# Altium footprint library COOP4403_FULL.PcbLib: 52 footprints (part 3 of 4)
Each footprint in its own frame and in the unit in brackets; x right, y up, seen from the top. Pads: shape width x height; smd on the part's side, far side on the other; paste and mask are expansions set on the pad; w line width, h text height; cw(c..) or ccw(c..) is an arc to the next point about the centre after c.
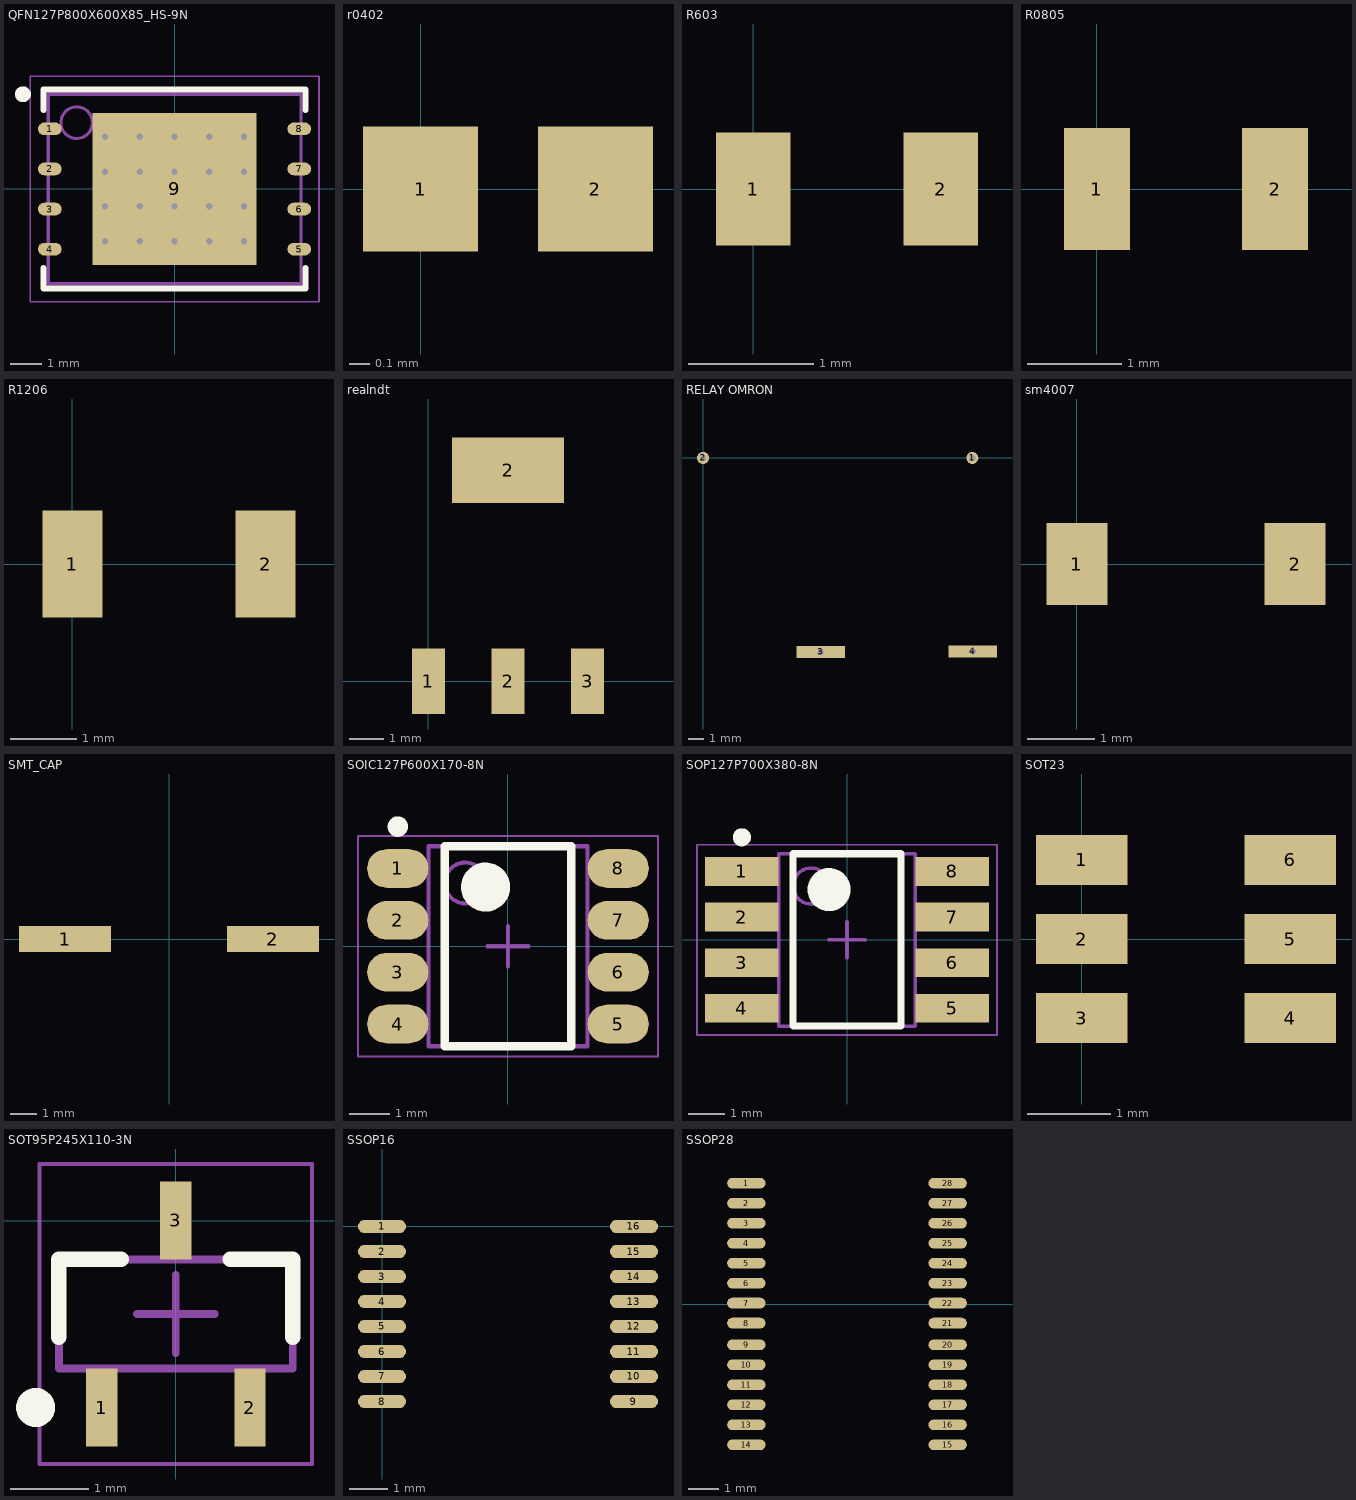
[diagram p2: the footprints below, top view; thin cyan lines are the x and y axes]

## QFN127P800X600X85_HS-9N [mm] "QFN, 8-Leads, Body 8.00x6.00mm, Pitch 1.27mm, Thermal Pad 5.20x4.80mm, IPC Medium Density"
height 0.85
pads (9):
  oval 0.75x0.4 smd: 1(-3.95,1.905) 2(-3.95,0.635) 3(-3.95,-0.635) 4(-3.95,-1.905) 5(3.95,-1.905) 6(3.95,-0.635) 7(3.95,0.635) 8(3.95,1.905)
  rect 5.2x4.8 smd: 9(0,0)
via 1.1,1.65 diameter 0.5 hole 0.2
via -2.2,1.65 diameter 0.5 hole 0.2
via -1.1,1.65 diameter 0.5 hole 0.2
via 0,1.65 diameter 0.5 hole 0.2
via 2.2,1.65 diameter 0.5 hole 0.2
via -2.2,0.55 diameter 0.5 hole 0.2
via -1.1,0.55 diameter 0.5 hole 0.2
via 0,0.55 diameter 0.5 hole 0.2
via 1.1,0.55 diameter 0.5 hole 0.2
via 2.2,0.55 diameter 0.5 hole 0.2
via -2.2,-0.55 diameter 0.5 hole 0.2
via -1.1,-0.55 diameter 0.5 hole 0.2
via 0,-0.55 diameter 0.5 hole 0.2
via 1.1,-0.55 diameter 0.5 hole 0.2
via 2.2,-0.55 diameter 0.5 hole 0.2
via -2.2,-1.65 diameter 0.5 hole 0.2
via -1.1,-1.65 diameter 0.5 hole 0.2
via 0,-1.65 diameter 0.5 hole 0.2
via 1.1,-1.65 diameter 0.5 hole 0.2
via 2.2,-1.65 diameter 0.5 hole 0.2
Top Overlay:
  circle w0.25: c-4.8,3 r0.125
  lines w0.2: -4.15,-2.505 -4.15,-3.15 0.035,-3.15 ; -4.15,2.505 -4.15,3.15 0.035,3.15 ; -0.035,-3.15 4.15,-3.15 4.15,-2.505 ; -0.035,3.15 4.15,3.15 4.15,2.505
Mechanical 13:
  circle w0.1: c-3.1,2.1 r0.5
  lines w0.1: -4,-3 -4,3 4,3 4,-3 -4,-3
Mechanical 15:
  lines w0.05: -4.575,-3.575 -4.575,3.575 4.575,3.575 4.575,-3.575 -4.575,-3.575
  lines w0.1: -0.5,0 0.5,0 ; 0,-0.5 0,0.5
3D body: height 0.85, standoff 0.05, extent -4,-3 4,3

## r0402 [mm]
pads (2):
  rect 0.55x0.6 smd: 1(0,0) 2(0.838,0)
3D body "User Library-RES_1005-0402.STEP": height 0.41, standoff 0, extent -0.168,-0.249 0.982,0.3

## R603 [mm]
pads (2):
  rect 0.6x0.9 smd: 1(0,0) 2(1.5,0)
3D body "User Library-RES0603-3.STEP": height 0.45, standoff 0, extent -0.089,-0.4 1.511,0.4

## R0805 [mm]
pads (2):
  rect 0.7x1.3 smd: 1(0,0) 2(1.9,0)
3D body "User Library-R SMD 0805.STEP": height 0.42, standoff -0.03, extent -0.085,-0.625 1.915,0.625

## R1206 [mm]
pads (2):
  rect 0.9x1.6 smd: 1(0,0) 2(2.9,0)
3D body "User Library-1206.STEP": height 0.53, standoff -0.03, extent -0.203,-0.812 2.997,0.788

## realndt [mm]
pads (4):
  rect 0.95x1.9 smd: 1(0,0) 2(2.3,0) 3(4.6,0)
  rect 3.25x1.9 smd: 2(2.3,6.1)

## RELAY OMRON [mm]
pads (4):
  round 0.8 hole 0.4: 1(17.78,0) 2(0,0)
  rect 3.2x0.8 hole 0.4 square: 3(7.772,-12.802) 4(17.805,-12.776)
3D body "g5ca-1a-e_5dc.stp": height 11, standoff -3.5, extent -2.009,-14.426 19.991,1.574

## S8 [mm]

## sm4007 [mm]
pads (2):
  rect 0.91x1.22 smd: 1(0,0) 2(3.25,0)

## SMT_CAP [mm]
pads (2):
  rect 3.5x1 smd: 1(-3.95,0) 2(3.95,0)
3D body "User Library-CL_series_size10x13,5.STEP": height 13.5, standoff 0, extent -5.438,-5.201 5.462,5.099

## SOIC127P600X170-8N [mm] "SOIC, 8-Leads, Body 4.90x3.90mm, Pitch 1.27mm, IPC Medium Density"
height 1.7
pads (8):
  oval 1.5x0.95 smd: 1(-2.7,1.905) 2(-2.7,0.635) 3(-2.7,-0.635) 4(-2.7,-1.905) 5(2.7,-1.905) 6(2.7,-0.635) 7(2.7,0.635) 8(2.7,1.905)
Top Overlay:
  circle w0.25: c-2.7,2.93 r0.125
  circle w0.6: c-0.55,1.45 r0.3
  lines w0.2: -1.55,-2.45 -1.55,2.45 1.55,2.45 1.55,-2.45 -1.55,-2.45
Mechanical 13:
  circle w0.1: c-1.05,1.55 r0.5
  lines w0.1: -1.95,-2.45 -1.95,2.45 1.95,2.45 1.95,-2.45 -1.95,-2.45
Mechanical 15:
  lines w0.05: -3.675,-2.7 -3.675,2.7 3.675,2.7 3.675,-2.7 -3.675,-2.7
  lines w0.1: -0.5,0 0.5,0 ; 0,-0.5 0,0.5
3D body: height 1.7, standoff 0.2, extent -1.95,-2.45 1.95,2.45

## SOP127P700X380-8N [mm] "SOP, 8-Leads, Body 4.80x3.80mm, Pitch 1.27mm, IPC Medium Density"
height 3.8
pads (8):
  rect 2.05x0.8 smd: 1(-2.925,1.905) 2(-2.925,0.635) 3(-2.925,-0.635) 4(-2.925,-1.905) 5(2.925,-1.905) 6(2.925,-0.635) 7(2.925,0.635) 8(2.925,1.905)
Top Overlay:
  circle w0.6: c-0.5,1.4 r0.3
  circle w0.25: c-2.925,2.855 r0.125
  lines w0.2: -1.5,-2.4 1.5,-2.4 1.5,2.4 -1.5,2.4 -1.5,-2.4
Mechanical 13:
  circle w0.1: c-1,1.5 r0.5
  lines w0.1: -1.9,-2.4 1.9,-2.4 1.9,2.4 -1.9,2.4 -1.9,-2.4
Mechanical 15:
  lines w0.05: -4.175,-2.65 4.175,-2.65 4.175,2.65 -4.175,2.65 -4.175,-2.65
  lines w0.1: -0.5,0 0.5,0 ; 0,-0.5 0,0.5
3D body: height 3.8, standoff 0.1, extent -1.9,-2.4 1.9,2.4

## SOT23 [mm]
pads (6):
  rect 1.1x0.6 smd: 1(0,0.95) 2(0,0) 3(0,-0.95) 4(2.5,-0.95) 5(2.5,0) 6(2.5,0.95)
3D body "SW3dPS-SOT23-6-1.STEP": height 1.09, standoff 0, extent -0.019,-1.397 2.407,1.397

## SOT95P245X110-3N [mm] "SOT23, 3-Leads, Body 2.90x2.45mm, Pitch 0.95mm, IPC Medium Density"
height 1.1
pads (3):
  rect 0.4x1 smd: 1(-0.95,-2.394) 2(0.95,-2.394) 3(0,0.006)
Top Overlay:
  circle w0.25: c-1.8,-2.394 r0.125
  lines w0.2: -1.5,-1.494 -1.5,-0.494 -0.7,-0.494 ; 0.7,-0.494 1.5,-0.494 1.5,-1.494
Mechanical 13:
  lines w0.1: -1.5,-1.894 -1.5,-0.494 1.5,-0.494 1.5,-1.894 -1.5,-1.894
Mechanical 15:
  lines w0.05: -1.75,-3.119 -1.75,0.731 1.75,0.731 1.75,-3.119 -1.75,-3.119
  lines w0.1: -0.5,-1.194 0.5,-1.194 ; 0,-1.694 0,-0.694
3D body: height 1.1, standoff 0.05, extent -1.5,-1.894 1.5,-0.494

## SSOP16 [mm]
pads (16):
  oval 1.25x0.35 smd: 1(0,0) 2(0,-0.65) 3(0,-1.3) 4(0,-1.95) 5(0,-2.6) 6(0,-3.25) 7(0,-3.9) 8(0,-4.55) 9(6.55,-4.55) 10(6.55,-3.9) 11(6.55,-3.25) 12(6.55,-2.6) 13(6.55,-1.95) 14(6.55,-1.3) 15(6.55,-0.65) 16(6.55,0)

## SSOP28 [mm]
pads (28):
  oval 1.25x0.35 smd: 1(65.938,3.937) 2(65.938,3.287) 3(65.938,2.637) 4(65.938,1.987) 5(65.938,1.337) 6(65.938,0.687) 7(65.938,0.037) 8(65.938,-0.613) 9(65.938,-1.321) 10(65.938,-1.971) 11(65.938,-2.621) 12(65.938,-3.271) 13(65.938,-3.921) 14(65.938,-4.571) 15(72.488,-4.571) 16(72.488,-3.921) 17(72.488,-3.271) 18(72.488,-2.621) 19(72.488,-1.971) 20(72.488,-1.321) 21(72.488,-0.613) 22(72.488,0.037) 23(72.488,0.687) 24(72.488,1.337) 25(72.488,1.987) 26(72.488,2.637) 27(72.488,3.287) 28(72.488,3.937)
3D body "User Library-SSOP-28-FT232RL.STEP": height 2.16, standoff 0, extent 65.312,-5.47 73.068,4.86